# Altium footprint library SparkFun-Connectors.PCBLIB: 409 footprints (part 6 of 26)
Each footprint in its own frame and in the unit in brackets; x right, y up, seen from the top. Pads: shape width x height; smd on the part's side, far side on the other; paste and mask are expansions set on the pad; w line width, h text height; cw(c..) or ccw(c..) is an arc to the next point about the centre after c.
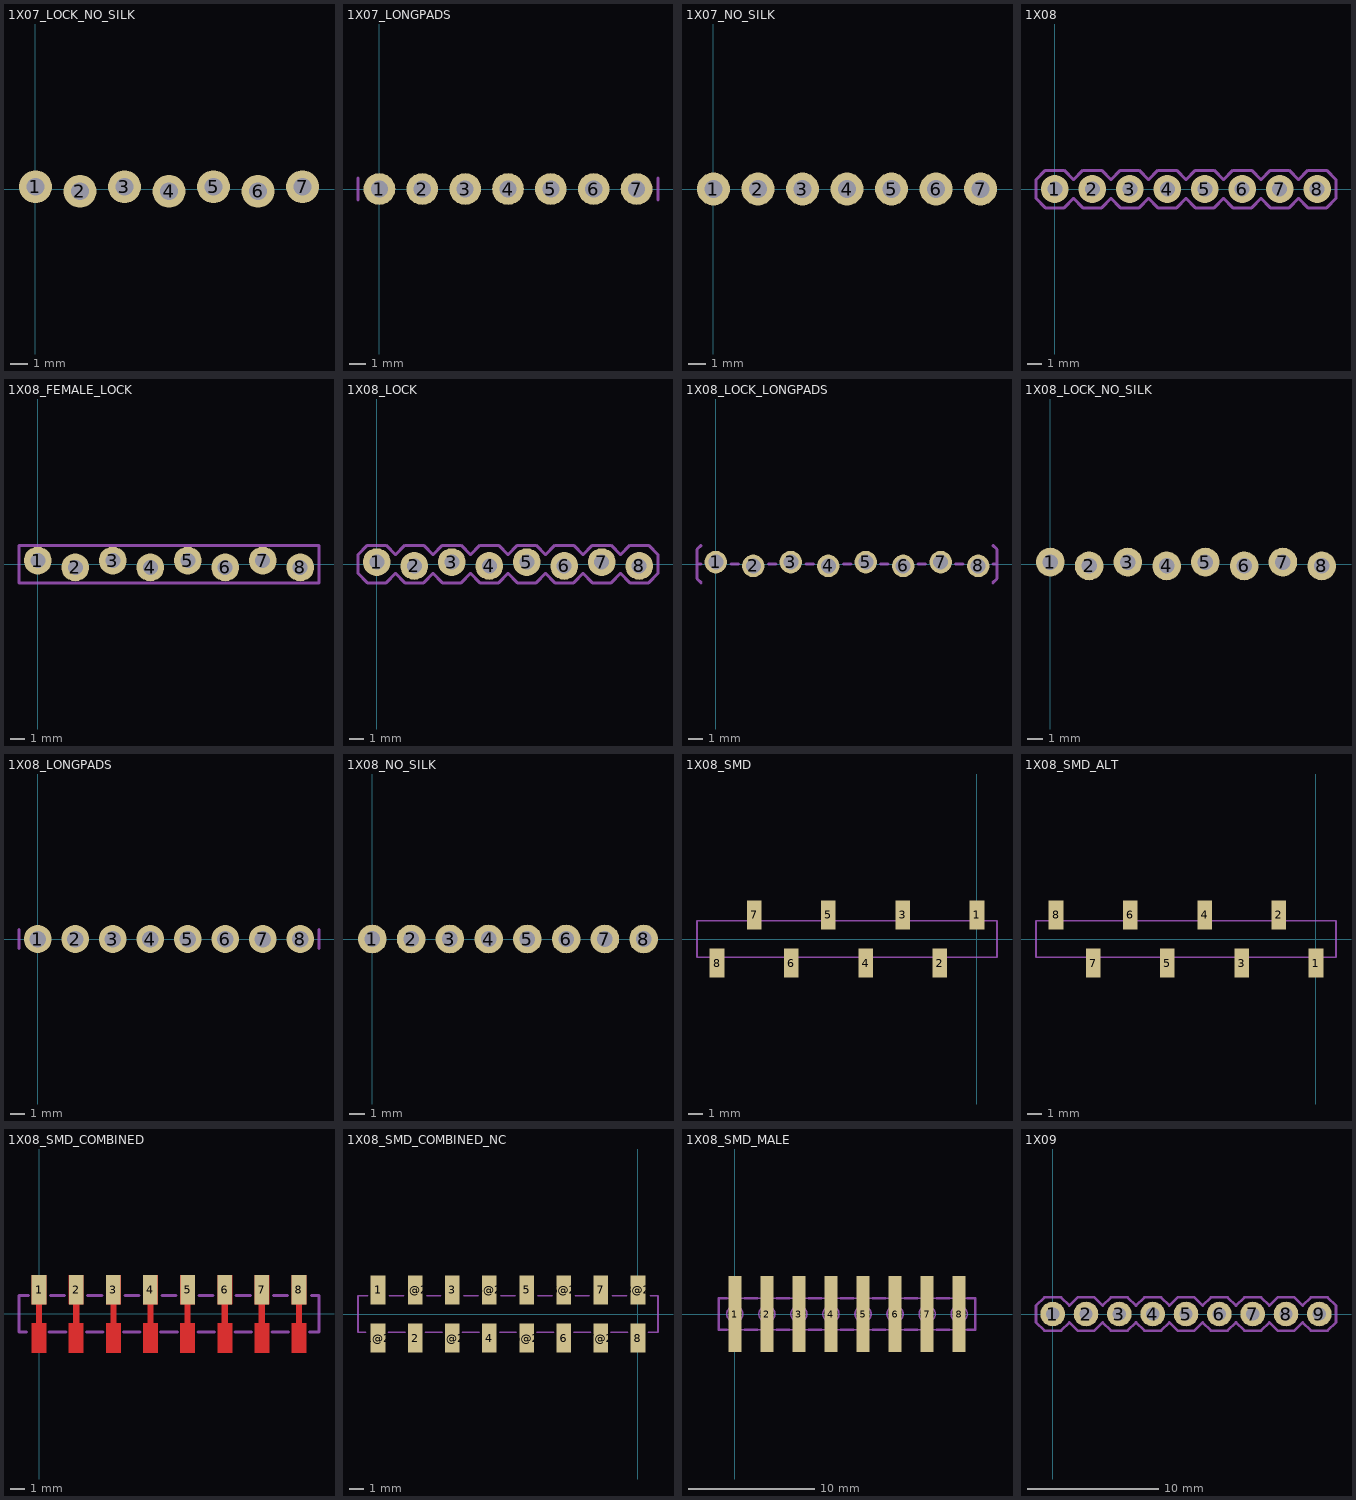
[diagram p5: the footprints below, top view; thin cyan lines are the x and y axes]

## 1X07_LOCK_NO_SILK [mil]
pads (7):
  round 74 hole 40: 1(0,5) 2(100,-5) 3(200,5) 4(300,-5) 5(400,5) 6(500,-5) 7(600,5)
tDocu:
  region: 590,-10 590,10 610,10 610,-10
  region: 490,-10 490,10 510,10 510,-10
  region: 390,-10 390,10 410,10 410,-10
  region: 290,-10 290,10 310,10 310,-10
  region: 190,-10 190,10 210,10 210,-10
  region: 90,-10 90,10 110,10 110,-10
  region: -10,-10 -10,10 10,10 10,-10

## 1X07_LONGPADS [mil]
pads (7):
  round 74 hole 40: 1(0,0) 2(100,0) 3(200,0) 4(300,0) 5(400,0) 6(500,0) 7(600,0)
tDocu:
  region: 590,-10 590,10 610,10 610,-10
  region: 490,-10 490,10 510,10 510,-10
  region: 390,-10 390,10 410,10 410,-10
  region: 290,-10 290,10 310,10 310,-10
  region: 190,-10 190,10 210,10 210,-10
  region: 90,-10 90,10 110,10 110,-10
  region: -10,-10 -10,10 10,10 10,-10
tPlace:
  lines w8: -50,-25 -50,25 ; 650,-25 650,25

## 1X07_NO_SILK [mil]
pads (7):
  round 74 hole 40: 1(0,0) 2(100,0) 3(200,0) 4(300,0) 5(400,0) 6(500,0) 7(600,0)
tDocu:
  region: 590,-10 590,10 610,10 610,-10
  region: 490,-10 490,10 510,10 510,-10
  region: 390,-10 390,10 410,10 410,-10
  region: 290,-10 290,10 310,10 310,-10
  region: 190,-10 190,10 210,10 210,-10
  region: 90,-10 90,10 110,10 110,-10
  region: -10,-10 -10,10 10,10 10,-10

## 1X08 [mil]
pads (8):
  round 74 hole 40: 1(0,0) 2(100,0) 3(200,0) 4(300,0) 5(400,0) 6(500,0) 7(600,0) 8(700,0)
tDocu:
  region: 590,-10 590,10 610,10 610,-10
  region: 490,-10 490,10 510,10 510,-10
  region: 390,-10 390,10 410,10 410,-10
  region: 290,-10 290,10 310,10 310,-10
  region: 190,-10 190,10 210,10 210,-10
  region: 90,-10 90,10 110,10 110,-10
  region: -10,-10 -10,10 10,10 10,-10
  region: 690,-10 690,10 710,10 710,-10
tPlace:
  lines w8: -50,-25 -50,25 -25,50 25,50 50,25 75,50 125,50 150,25 175,50 225,50 250,25 275,50 325,50 350,25 375,50 425,50 450,25 475,50 525,50 550,25 575,50 625,50 650,25 675,50 725,50 750,25 750,-25 725,-50 675,-50 650,-25 625,-50 575,-50 550,-25 525,-50 475,-50 450,-25 425,-50 375,-50 350,-25 325,-50 275,-50 250,-25 225,-50 175,-50 150,-25 125,-50 75,-50 50,-25 25,-50 -25,-50 -50,-25

## 1X08_FEMALE_LOCK [mil]
pads (8):
  round 74 hole 40: 1(0,9) 2(100,-9) 3(200,9) 4(300,-9) 5(400,9) 6(500,-9) 7(600,9) 8(700,-9)
tDocu:
  region: -12.5,-7.5 -12.5,7.5 12.5,7.5 12.5,-7.5
  region: 87.5,-7.5 87.5,7.5 112.5,7.5 112.5,-7.5
  region: 187.5,-7.5 187.5,7.5 212.5,7.5 212.5,-7.5
  region: 287.5,-7.5 287.5,7.5 312.5,7.5 312.5,-7.5
  region: 387.5,-7.5 387.5,7.5 412.5,7.5 412.5,-7.5
  region: 487.5,-7.5 487.5,7.5 512.5,7.5 512.5,-7.5
  region: 587.5,-7.5 587.5,7.5 612.5,7.5 612.5,-7.5
  region: 687.5,-7.5 687.5,7.5 712.5,7.5 712.5,-7.5
tPlace:
  lines w8: -50,-50 -50,50 750,50 750,-50 -50,-50

## 1X08_LOCK [mil]
pads (8):
  round 74 hole 40: 1(0,5) 2(100,-5) 3(200,5) 4(300,-5) 5(400,5) 6(500,-5) 7(600,5) 8(700,-5)
tDocu:
  region: 590,-10 590,10 610,10 610,-10
  region: 490,-10 490,10 510,10 510,-10
  region: 390,-10 390,10 410,10 410,-10
  region: 290,-10 290,10 310,10 310,-10
  region: 190,-10 190,10 210,10 210,-10
  region: 90,-10 90,10 110,10 110,-10
  region: -10,-10 -10,10 10,10 10,-10
  region: 690,-10 690,10 710,10 710,-10
tPlace:
  lines w8: -50,-25 -50,25 -25,50 25,50 50,25 75,50 125,50 150,25 175,50 225,50 250,25 275,50 325,50 350,25 375,50 425,50 450,25 475,50 525,50 550,25 575,50 625,50 650,25 675,50 725,50 750,25 750,-25 725,-50 675,-50 650,-25 625,-50 575,-50 550,-25 525,-50 475,-50 450,-25 425,-50 375,-50 350,-25 325,-50 275,-50 250,-25 225,-50 175,-50 150,-25 125,-50 75,-50 50,-25 25,-50 -25,-50 -50,-25

## 1X08_LOCK_LONGPADS [mil]
pads (8):
  round 60 hole 40: 1(0,5) 2(100,-5) 3(200,5) 4(300,-5) 5(400,5) 6(500,-5) 7(600,5) 8(700,-5)
tDocu:
  region: -11.5,-11.5 -11.5,11.5 11.5,11.5 11.5,-11.5
  region: 88.5,-11.5 88.5,11.5 111.5,11.5 111.5,-11.5
  region: 188.5,-11.5 188.5,11.5 211.5,11.5 211.5,-11.5
  region: 311.5,-11.5 288.5,-11.5 288.5,11.5 311.5,11.5
  region: 388.5,-11.5 388.5,11.5 411.5,11.5 411.5,-11.5
  region: 488.5,-11.5 488.5,11.5 511.5,11.5 511.5,-11.5
  region: 588.5,-11.5 588.5,11.5 611.5,11.5 611.5,-11.5
  region: 688.5,-11.5 688.5,11.5 711.5,11.5 711.5,-11.5
tPlace:
  lines w8: -40,0 -50,0 ; -39,-50 -50,-39 -50,0 ; -39,50 -50,39 -50,0 ; 40,0 60,0 ; 140,0 160,0 ; 240,0 260,0 ; 340,0 360,0 ; 440,0 460,0 ; 540,0 560,0 ; 640,0 660,0 ; 739,-50 750,-39 750,0 ; 739,50 750,39 750,0 ; 740,0 750,0

## 1X08_LOCK_NO_SILK [mil]
pads (8):
  round 74 hole 40: 1(0,5) 2(100,-5) 3(200,5) 4(300,-5) 5(400,5) 6(500,-5) 7(600,5) 8(700,-5)
tDocu:
  region: 590,-10 590,10 610,10 610,-10
  region: 490,-10 490,10 510,10 510,-10
  region: 390,-10 390,10 410,10 410,-10
  region: 290,-10 290,10 310,10 310,-10
  region: 190,-10 190,10 210,10 210,-10
  region: 90,-10 90,10 110,10 110,-10
  region: -10,-10 -10,10 10,10 10,-10
  region: 690,-10 690,10 710,10 710,-10

## 1X08_LONGPADS [mil]
pads (8):
  round 74 hole 44: 1(0,0) 2(100,0) 3(200,0) 4(300,0) 5(400,0) 6(500,0) 7(600,0) 8(700,0)
tDocu:
  region: 590,-10 590,10 610,10 610,-10
  region: 490,-10 490,10 510,10 510,-10
  region: 390,-10 390,10 410,10 410,-10
  region: 290,-10 290,10 310,10 310,-10
  region: 190,-10 190,10 210,10 210,-10
  region: 90,-10 90,10 110,10 110,-10
  region: -10,-10 -10,10 10,10 10,-10
  region: 690,-10 690,10 710,10 710,-10
tPlace:
  lines w8: -50,-25 -50,25 ; 750,-25 750,25

## 1X08_NO_SILK [mil]
pads (8):
  round 74 hole 40: 1(0,0) 2(100,0) 3(200,0) 4(300,0) 5(400,0) 6(500,0) 7(600,0) 8(700,0)
tDocu:
  region: 590,-10 590,10 610,10 610,-10
  region: 490,-10 490,10 510,10 510,-10
  region: 390,-10 390,10 410,10 410,-10
  region: 290,-10 290,10 310,10 310,-10
  region: 190,-10 190,10 210,10 210,-10
  region: 90,-10 90,10 110,10 110,-10
  region: -10,-10 -10,10 10,10 10,-10
  region: 690,-10 690,10 710,10 710,-10

## 1X08_SMD [mm]
pads (8):
  rect 1x2 smd: 1(0,1.65) 2(-2.54,-1.65) 3(-5.08,1.65) 4(-7.62,-1.65) 5(-10.16,1.65) 6(-12.7,-1.65) 7(-15.24,1.65) 8(-17.78,-1.65)
tDocu:
  lines w0.127: -19.15,-1.25 -19.15,1.25 1.37,1.25 1.37,-1.25 -19.15,-1.25
tPlace:
  lines w0.127: -18.63,-1.25 -19.15,-1.25 -19.15,1.25 -15.963,1.25 ; -16.991,-1.25 -13.489,-1.25 ; -14.537,1.25 -10.863,1.25 ; -11.911,-1.25 -8.409,-1.25 ; -9.457,1.25 -5.783,1.25 ; -6.831,-1.25 -3.329,-1.25 ; -4.377,1.25 -0.703,1.25 ; -1.817,-1.25 1.37,-1.25 1.37,1.25 0.85,1.25

## 1X08_SMD_ALT [mm]
pads (8):
  rect 1x2 smd: 1(0,-1.65) 2(-2.54,1.65) 3(-5.08,-1.65) 4(-7.62,1.65) 5(-10.16,-1.65) 6(-12.7,1.65) 7(-15.24,-1.65) 8(-17.78,1.65)
tDocu:
  lines w0.127: -19.15,-1.25 -19.15,1.25 1.37,1.25 1.37,-1.25 -19.15,-1.25
tPlace:
  lines w0.127: -18.63,1.25 -19.15,1.25 -19.15,-1.25 -15.963,-1.25 ; -17.077,1.25 -13.403,1.25 ; -14.451,-1.25 -10.949,-1.25 ; -11.997,1.25 -8.323,1.25 ; -9.371,-1.25 -5.869,-1.25 ; -6.917,1.25 -3.243,1.25 ; -4.291,-1.25 -0.789,-1.25 ; -1.817,1.25 1.37,1.25 1.37,-1.25 0.85,-1.25

## 1X08_SMD_COMBINED [mm]
pads (8):
  rect 1x2 smd paste+0 mask+0: 1(0,1.65) 2(2.54,1.65) 3(5.08,1.65) 4(7.62,1.652) 5(10.16,1.65) 6(12.7,1.652) 7(15.24,1.65) 8(17.78,1.652)
Top:
  region: 2.04,2.65 3.04,2.65 3.04,0.65 2.74,0.65 2.74,-0.65 3.04,-0.65 3.04,-2.65 2.04,-2.65 2.04,-0.65 2.34,-0.65 2.34,0.65 2.04,0.65
  region: -0.5,2.65 0.5,2.65 0.5,0.65 0.2,0.65 0.2,-0.65 0.5,-0.65 0.5,-2.65 -0.5,-2.65 -0.5,-0.65 -0.2,-0.65 -0.2,0.65 -0.5,0.65
  region: 4.59,2.65 5.59,2.65 5.59,0.65 5.29,0.65 5.29,-0.65 5.59,-0.65 5.59,-2.65 4.59,-2.65 4.59,-0.65 4.89,-0.65 4.89,0.65 4.59,0.65
  region: 7.12,2.65 8.12,2.65 8.12,0.65 7.82,0.65 7.82,-0.65 8.12,-0.65 8.12,-2.65 7.12,-2.65 7.12,-0.65 7.42,-0.65 7.42,0.65 7.12,0.65
  region: 9.66,2.65 10.66,2.65 10.66,0.65 10.36,0.65 10.36,-0.65 10.66,-0.65 10.66,-2.65 9.66,-2.65 9.66,-0.65 9.96,-0.65 9.96,0.65 9.66,0.65
  region: 12.21,2.65 13.21,2.65 13.21,0.65 12.91,0.65 12.91,-0.65 13.21,-0.65 13.21,-2.65 12.21,-2.65 12.21,-0.65 12.51,-0.65 12.51,0.65 12.21,0.65
  region: 17.28,2.65 18.28,2.65 18.28,0.65 17.98,0.65 17.98,-0.65 18.28,-0.65 18.28,-2.65 17.28,-2.65 17.28,-0.65 17.58,-0.65 17.58,0.65 17.28,0.65
  region: 14.74,2.65 15.74,2.65 15.74,0.65 15.44,0.65 15.44,-0.65 15.74,-0.65 15.74,-2.65 14.74,-2.65 14.74,-0.65 15.04,-0.65 15.04,0.65 14.74,0.65
Top Paste:
  region: 3.12,-0.56 3.12,-2.76 1.92,-2.76 1.92,-0.56
  region: 3.14,2.74 3.14,0.54 1.94,0.54 1.94,2.74
  region: 0.58,-0.56 0.58,-2.76 -0.62,-2.76 -0.62,-0.56
  region: 0.6,2.74 0.6,0.54 -0.6,0.54 -0.6,2.74
  region: 5.67,-0.56 5.67,-2.76 4.47,-2.76 4.47,-0.56
  region: 5.69,2.74 5.69,0.54 4.49,0.54 4.49,2.74
  region: 8.2,-0.56 8.2,-2.76 7,-2.76 7,-0.56
  region: 8.22,2.74 8.22,0.54 7.02,0.54 7.02,2.74
  region: 10.74,-0.56 10.74,-2.76 9.54,-2.76 9.54,-0.56
  region: 10.76,2.74 10.76,0.54 9.56,0.54 9.56,2.74
  region: 13.29,-0.56 13.29,-2.76 12.09,-2.76 12.09,-0.56
  region: 13.31,2.74 13.31,0.54 12.11,0.54 12.11,2.74
  region: 18.36,-0.56 18.36,-2.76 17.16,-2.76 17.16,-0.56
  region: 18.38,2.74 18.38,0.54 17.18,0.54 17.18,2.74
  region: 15.82,-0.56 15.82,-2.76 14.62,-2.76 14.62,-0.56
  region: 15.84,2.74 15.84,0.54 14.64,0.54 14.64,2.74
Top Solder:
  region: 3.12,-0.56 3.12,-2.76 1.92,-2.76 1.92,-0.56
  region: 3.14,2.74 3.14,0.54 1.94,0.54 1.94,2.74
  region: 0.58,-0.56 0.58,-2.76 -0.62,-2.76 -0.62,-0.56
  region: 0.6,2.74 0.6,0.54 -0.6,0.54 -0.6,2.74
  region: 5.67,-0.56 5.67,-2.76 4.47,-2.76 4.47,-0.56
  region: 5.69,2.74 5.69,0.54 4.49,0.54 4.49,2.74
  region: 8.2,-0.56 8.2,-2.76 7,-2.76 7,-0.56
  region: 8.22,2.74 8.22,0.54 7.02,0.54 7.02,2.74
  region: 10.74,-0.56 10.74,-2.76 9.54,-2.76 9.54,-0.56
  region: 10.76,2.74 10.76,0.54 9.56,0.54 9.56,2.74
  region: 13.29,-0.56 13.29,-2.76 12.09,-2.76 12.09,-0.56
  region: 13.31,2.74 13.31,0.54 12.11,0.54 12.11,2.74
  region: 18.36,-0.56 18.36,-2.76 17.16,-2.76 17.16,-0.56
  region: 18.38,2.74 18.38,0.54 17.18,0.54 17.18,2.74
  region: 15.82,-0.56 15.82,-2.76 14.62,-2.76 14.62,-0.56
  region: 15.84,2.74 15.84,0.54 14.64,0.54 14.64,2.74
tPlace:
  lines w0.203: -0.85,-1.25 -1.37,-1.25 -1.37,1.25 -0.723,1.25 ; 0.693,-1.24 1.827,-1.24 ; 0.703,-1.25 1.837,-1.25 ; 0.789,1.25 1.751,1.25 ; 3.243,-1.25 4.377,-1.25 ; 3.329,1.25 4.291,1.25 ; 5.783,-1.25 6.917,-1.25 ; 5.869,1.25 6.831,1.25 ; 8.323,-1.25 9.457,-1.25 ; 8.409,1.25 9.371,1.25 ; 10.863,-1.25 11.997,-1.25 ; 10.949,1.25 11.911,1.25 ; 13.403,-1.25 14.537,-1.25 ; 13.489,1.25 14.451,1.25 ; 15.943,-1.25 17.077,-1.25 ; 16.029,1.25 16.991,1.25 ; 18.503,-1.25 19.15,-1.25 19.15,1.25 18.63,1.25

## 1X08_SMD_COMBINED_NC [mm]
pads (16):
  rect 1x2 smd: 1(-17.78,1.65) 1@2(-17.78,-1.65) 2(-15.24,-1.65) 2@2(-15.24,1.65) 3(-12.7,1.65) 3@2(-12.7,-1.65) 4(-10.16,-1.65) 4@2(-10.16,1.65) 5(-7.62,1.65) 5@2(-7.62,-1.65) 6(-5.08,-1.65) 6@2(-5.08,1.65) 7(-2.54,1.65) 7@2(-2.54,-1.65) 8(0,-1.65) 8@2(0,1.65)
tPlace:
  lines w0.127: -18.63,-1.25 -19.15,-1.25 -19.15,1.25 -18.503,1.25 ; -17.077,-1.25 -15.943,-1.25 ; -16.991,1.25 -16.029,1.25 ; -14.537,-1.25 -13.403,-1.25 ; -14.451,1.25 -13.489,1.25 ; -11.997,-1.25 -10.863,-1.25 ; -11.911,1.25 -10.949,1.25 ; -9.457,-1.25 -8.323,-1.25 ; -9.371,1.25 -8.409,1.25 ; -6.917,-1.25 -5.783,-1.25 ; -6.831,1.25 -5.869,1.25 ; -4.377,-1.25 -3.243,-1.25 ; -4.291,1.25 -3.329,1.25 ; -1.837,-1.25 -0.703,-1.25 ; -1.751,1.25 -0.789,1.25 ; 0.723,-1.25 1.37,-1.25 1.37,1.25 0.85,1.25

## 1X08_SMD_MALE [mm]
pads (8):
  rect 1.02x6 smd: 1(0,0) 2(2.54,0) 3(5.08,0) 4(7.62,0) 5(10.16,0) 6(12.7,0) 7(15.24,0) 8(17.78,0)
tDocu:
  circle w0.127: c0,0 r0.64
  circle w0.127: c2.54,0 r0.64
  circle w0.127: c5.08,0 r0.64
  circle w0.127: c7.62,0 r0.64
  circle w0.127: c10.16,0 r0.64
  circle w0.127: c12.7,0 r0.64
  circle w0.127: c15.24,0 r0.64
  circle w0.127: c17.78,0 r0.64
  region: -0.32,0 -0.32,2.75 0.32,2.75 0.32,0
  region: 4.76,0 4.76,2.75 5.4,2.75 5.4,0
  region: 9.84,0 9.84,2.75 10.48,2.75 10.48,0
  region: 2.86,0 2.86,-2.75 2.22,-2.75 2.22,0
  region: 7.94,0 7.94,-2.75 7.3,-2.75 7.3,0
  region: 13.02,0 13.02,-2.75 12.38,-2.75 12.38,0
  region: 14.92,0 14.92,2.75 15.56,2.75 15.56,0
  region: 18.1,0 18.1,-2.75 17.46,-2.75 17.46,0
  lines w0.127: -1.27,-1.25 -1.27,1.25 19.05,1.25 19.05,-1.25 -1.27,-1.25
tPlace:
  lines w0.178: -0.635,-1.25 -1.27,-1.25 -1.27,1.25 -0.635,1.25 ; 0.762,-1.25 1.778,-1.25 ; 0.762,1.25 1.778,1.25 ; 3.302,-1.25 4.318,-1.25 ; 3.302,1.25 4.318,1.25 ; 5.842,-1.25 6.858,-1.25 ; 5.842,1.25 6.858,1.25 ; 8.382,-1.25 9.398,-1.25 ; 8.382,1.25 9.398,1.25 ; 10.922,-1.25 11.938,-1.25 ; 10.922,1.25 11.938,1.25 ; 13.462,-1.25 14.478,-1.25 ; 13.462,1.25 14.478,1.25 ; 16.002,-1.25 17.018,-1.25 ; 16.002,1.25 17.018,1.25 ; 18.415,-1.25 19.05,-1.25 19.05,1.25 18.415,1.25

## 1X09 [mil]
pads (9):
  round 74 hole 40: 1(0,0) 2(100,0) 3(200,0) 4(300,0) 5(400,0) 6(500,0) 7(600,0) 8(700,0) 9(800,0)
tDocu:
  region: 590,-10 590,10 610,10 610,-10
  region: 490,-10 490,10 510,10 510,-10
  region: 390,-10 390,10 410,10 410,-10
  region: 290,-10 290,10 310,10 310,-10
  region: 190,-10 190,10 210,10 210,-10
  region: 90,-10 90,10 110,10 110,-10
  region: -10,-10 -10,10 10,10 10,-10
  region: 690,-10 690,10 710,10 710,-10
  region: 790,-10 790,10 810,10 810,-10
tPlace:
  lines w8: -50,-25 -50,25 -25,50 25,50 50,25 75,50 125,50 150,25 175,50 225,50 250,25 275,50 325,50 350,25 375,50 425,50 450,25 475,50 525,50 550,25 575,50 625,50 650,25 675,50 725,50 750,25 775,50 825,50 850,25 850,-25 825,-50 775,-50 750,-25 725,-50 675,-50 650,-25 625,-50 575,-50 550,-25 525,-50 475,-50 450,-25 425,-50 375,-50 350,-25 325,-50 275,-50 250,-25 225,-50 175,-50 150,-25 125,-50 75,-50 50,-25 25,-50 -25,-50 -50,-25